# Altium footprint library 智能锁实践教学平台.PcbLib: 58 footprints (part 4 of 4)
Each footprint in its own frame and in the unit in brackets; x right, y up, seen from the top. Pads: shape width x height; smd on the part's side, far side on the other; paste and mask are expansions set on the pad; w line width, h text height; cw(c..) or ccw(c..) is an arc to the next point about the centre after c.
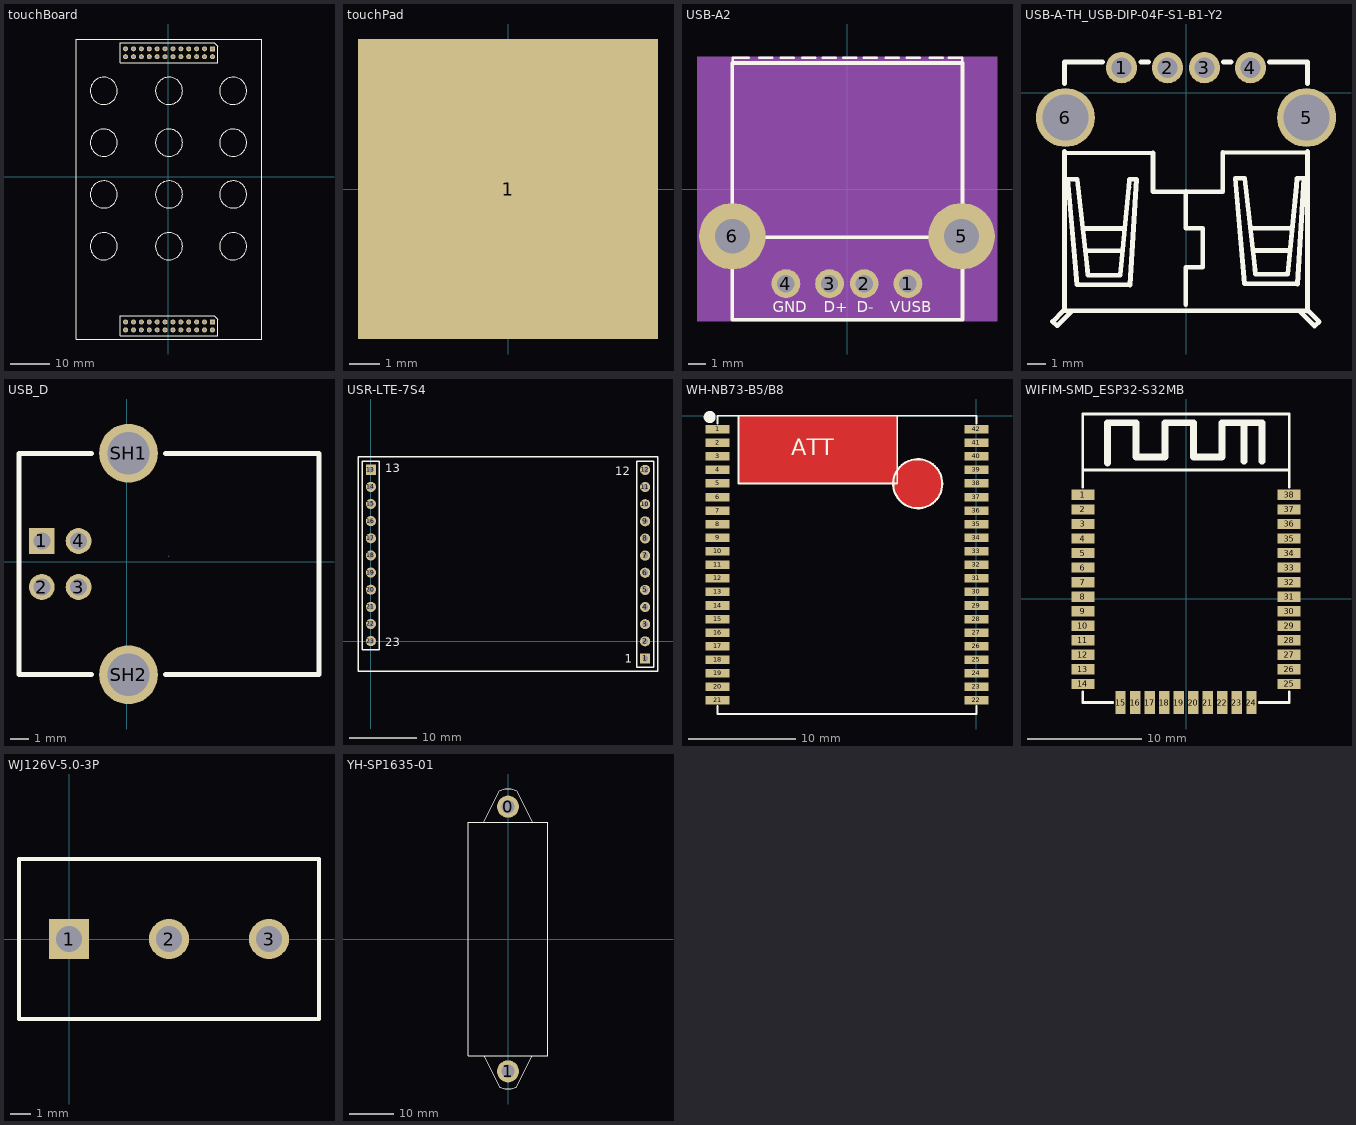
[diagram p3: the footprints below, top view; thin cyan lines are the x and y axes]

## touchBoard [mm]
pads (48):
  rect 1.27x1.27 / inner round 1.524 / far side rect 1.27x1.27 hole 0.7: 1(11.132,-36.846) 25(11.132,32.369)
  round 1.27 / inner round 1.524 / far side round 1.27 hole 0.7: 2(11.132,-38.846) 3(9.132,-36.846) 4(9.132,-38.846) 5(7.132,-36.846) 6(7.132,-38.846) 7(5.132,-36.846) 8(5.132,-38.846) 9(3.132,-36.846) 10(3.132,-38.846) 11(1.132,-36.846) 12(1.132,-38.846) 13(-0.868,-36.846) 14(-0.868,-38.846) 15(-2.868,-36.846) 16(-2.868,-38.846) 17(-4.868,-36.846) 18(-4.868,-38.846) 19(-6.868,-36.846) 20(-6.868,-38.846) 21(-8.868,-36.846) 22(-8.868,-38.846) 23(-10.868,-36.846) 24(-10.868,-38.846) 26(11.132,30.369) 27(9.132,32.369) 28(9.132,30.369) 29(7.132,32.369) 30(7.132,30.369) 31(5.132,32.369) 32(5.132,30.369) 33(3.132,32.369) 34(3.132,30.369) 35(1.132,32.369) 36(1.132,30.369) 37(-0.868,32.369) 38(-0.868,30.369) 39(-2.868,32.369) 40(-2.868,30.369) 41(-4.868,32.369) 42(-4.868,30.369) 43(-6.868,32.369) 44(-6.868,30.369) 45(-8.868,32.369) 46(-8.868,30.369) 47(-10.868,32.369) 48(-10.868,30.369)
Top Overlay:
  circle w0.254: c16.388,-17.653 r3.431
  circle w0.254: c0.132,-17.653 r3.431
  circle w0.254: c-16.378,-17.653 r3.431
  circle w0.254: c0.132,-4.53 r3.431
  circle w0.254: c-16.378,-4.53 r3.431
  circle w0.254: c-16.378,8.594 r3.431
  circle w0.254: c0.132,8.594 r3.431
  circle w0.254: c16.388,-4.53 r3.431
  circle w0.254: c16.388,8.594 r3.431
  circle w0.254: c16.388,21.717 r3.431
  circle w0.254: c0.132,21.717 r3.431
  circle w0.254: c-16.378,21.717 r3.431
  lines w0.203: -23.368,-41.148 23.632,-41.148 23.632,34.852 -23.368,34.852 -23.368,-41.148 ; -12.229,-40.386 12.432,-40.386 12.432,-36.176 11.562,-35.306 -12.229,-35.306 -12.229,-40.386 ; -12.229,28.829 12.432,28.829 12.432,33.039 11.562,33.909 -12.229,33.909 -12.229,28.829
Mechanical 8:
  text "3" at 8.878,-36.846 h0.64
  text "15" at -3.376,-36.846 h0.64
  text "14" at -1.376,-38.846 h0.64
  text "4" at 8.878,-38.846 h0.64
  text "13" at -1.376,-36.846 h0.64
  text "17" at -5.376,-36.846 h0.64
  text "18" at -5.376,-38.846 h0.64
  text "19" at -7.376,-36.846 h0.64
  text "20" at -7.376,-38.846 h0.64
  text "16" at -3.376,-38.846 h0.64
  text "8" at 4.878,-38.846 h0.64
  text "10" at 2.624,-38.846 h0.64
  text "7" at 4.878,-36.846 h0.64
  text "9" at 2.878,-36.846 h0.64
  text "12" at 0.624,-38.846 h0.64
  text "11" at 0.624,-36.846 h0.64
  text "6" at 6.878,-38.846 h0.64
  text "5" at 6.878,-36.846 h0.64
  text "1" at 10.878,-36.846 h0.64
  text "2" at 10.878,-38.846 h0.64
  text "3" at 8.878,32.369 h0.64
  text "15" at -3.376,32.369 h0.64
  text "14" at -1.376,30.369 h0.64
  text "4" at 8.878,30.369 h0.64
  text "13" at -1.376,32.369 h0.64
  text "17" at -5.376,32.369 h0.64
  text "18" at -5.376,30.369 h0.64
  text "19" at -7.376,32.369 h0.64
  text "20" at -7.376,30.369 h0.64
  text "16" at -3.376,30.369 h0.64
  text "8" at 4.878,30.369 h0.64
  text "10" at 2.624,30.369 h0.64
  text "7" at 4.878,32.369 h0.64
  text "9" at 2.878,32.369 h0.64
  text "12" at 0.624,30.369 h0.64
  text "11" at 0.624,32.369 h0.64
  text "6" at 6.878,30.369 h0.64
  text "5" at 6.878,32.369 h0.64
  text "1" at 10.878,32.369 h0.64
  text "2" at 10.878,30.369 h0.64

## touchPad [mm]
pads (1):
  rect 10x10 smd: 1(0,0)

## USB-A2 [mil] "USB-A2"
pads (6):
  round 65 / inner round 60 / far side round 65 hole 39.37: 1(137.6,-213.75) 2(39,-213.75) 3(-39.5,-213.75) 4(-138,-213.75)
  round 150 / inner round 60 / far side round 150 hole 78.74: 5(259,-106.75) 6(-259,-106.75)
Top Overlay:
  lines w6: -258.4,284.25 -258.4,296.25 -222.4,296.25 ; -198.4,296.25 -169.4,296.25 ; -149.4,296.25 -120.4,296.25 ; -101.4,296.25 -72.4,296.25 ; -54.4,296.25 -25.4,296.25 ; -8.4,296.25 20.6,296.25 ; 37.6,296.25 66.6,296.25 ; 87.6,296.25 116.6,296.25 ; 135.6,296.25 164.6,296.25 ; 187.6,296.25 216.6,296.25 ; 230.6,296.25 260.6,296.25 260.6,284.25
  lines w8: -259,-106.75 -259,-295.25 261,-295.25 261,284.75 -259,284.75 -259,-107.15 -257.4,-108.75 257.6,-108.75
  text "GND" at -167.4,-278.75 h25
  text "D+" at -52.4,-278.75 h25
  text "D-" at 22.6,-278.75 h25
  text "VUSB" at 97.6,-278.75 h25
Mechanical 8:
  text "6" at -259,-96.75 h25
  text "4" at -138,-203.75 h25
  text "5" at 259,-96.75 h25
  text "1" at 137.6,-203.75 h25
  text "3" at -39.5,-203.75 h25
  text "2" at 39,-203.75 h25
Mechanical 10:
  region: -339,-299.25 339,-299.25 339,299.25 -339,299.25

## USB-A-TH_USB-DIP-04F-S1-B1-Y2 [mm]
pads (6):
  round 1.7 hole 1.1: 1(-3.5,1.355) 2(-1,1.355) 3(1,1.355) 4(3.5,1.355)
  round 3.2 hole 2.5: 5(6.55,-1.355) 6(-6.55,-1.355)
Top Overlay:
  lines w0.254: -6.6,-3.292 -1.79,-3.266 -1.79,-5.388 1.99,-5.388 1.99,-3.245 6.59,-3.261 ; -6.6,-3.185 -6.6,-11.861 ; -6.6,0.475 -6.6,1.659 -4.537,1.659 ; -6.177,-11.861 -6.986,-12.67 -7.01,-12.67 -7.24,-12.44 -7.25,-12.44 -6.671,-11.861 -6.6,-11.861 ; -5.609,-7.385 -3.349,-7.385 ; -5.469,-8.595 -3.439,-8.595 ; -2.463,1.659 -2.037,1.659 ; -0.01,-11.525 -0.01,-9.495 0.91,-9.495 0.91,-7.375 -0.01,-7.375 -0.01,-5.355 ; 2.037,1.659 2.463,1.659 ; 3.49,-7.366 5.75,-7.366 ; 3.63,-8.576 5.66,-8.576 ; 4.537,1.659 6.6,1.659 6.6,0.475 ; 6.17,-11.87 6.979,-12.679 7.003,-12.679 7.233,-12.449 7.243,-12.449 6.664,-11.87 6.593,-11.87 ; 6.6,-3.185 6.6,-11.861 -6.6,-11.861 ; -6.42,-4.706 -5.911,-4.709 -5.401,-9.25 -5.325,-9.928 -3.576,-9.917 -3.102,-5.139 -3.072,-4.709 -2.691,-4.709 -3.041,-10.452 -5.925,-10.441 -6.42,-4.706 ; 2.682,-4.652 3.19,-4.656 3.701,-9.196 3.776,-9.874 5.526,-9.864 6,-5.085 6.03,-4.655 6.41,-4.655 6.06,-10.398 3.177,-10.387 2.682,-4.652

## USB_D [mm]
pads (6):
  rect 1.4x1.4 hole 0.92: 1(-4.602,1.123)
  round 1.4 hole 0.92: 2(-4.602,-1.377) 3(-2.602,-1.377) 4(-2.602,1.123)
  round 3.2 hole 2.3: SH1(0.108,5.893) SH2(0.108,-6.147)
Top Overlay:
  lines w0.254: -5.842,-6.128 -1.892,-6.128 ; -5.842,-6.128 -5.842,5.874 ; -5.842,5.873 -1.892,5.873 ; 2.108,-6.127 10.458,-6.127 10.458,5.874 ; 2.108,5.873 10.458,5.873
Mechanical 15:
  lines w0.003: 2.283,0.27 2.333,0.321

## USR-LTE-7S4 [mm]
pads (23):
  rect 1.5x1.5 hole 0.85: 1(40.64,-2.565) 13(0,25.4)
  round 1.5 hole 0.85: 2(40.64,-0.025) 3(40.64,2.515) 4(40.64,5.055) 5(40.64,7.595) 6(40.64,10.135) 7(40.64,12.675) 8(40.64,15.215) 9(40.64,17.755) 10(40.64,20.295) 11(40.64,22.835) 12(40.64,25.375) 14(0,22.86) 15(0,20.32) 16(0,17.78) 17(0,15.24) 18(0,12.7) 19(0,10.16) 20(0,7.62) 21(0,5.08) 22(0,2.54) 23(0,0)
Top Overlay:
  lines w0.2: -1.27,-1.27 1.27,-1.27 1.27,26.67 -1.27,26.67 -1.27,24.765 -1.27,-1.27 ; 39.37,-3.835 39.37,26.645 41.91,26.645 41.91,-1.93 41.91,-3.835 39.37,-3.835
  lines w0.203: -1.905,-4.445 -1.905,27.305 42.545,27.305 42.545,-4.445 -1.905,-4.445
  text "1" at 37.592,-3.2 h1.27
  text "12" at 36.195,24.613 h1.27
  text "13" at 2.16,24.994 h1.27
  text "23" at 2.159,-0.787 h1.27

## WH-NB73-B5/B8 [mm]
pads (42):
  rect 2.25x0.8 smd: 1(-24.25,-1.27) 2(-24.25,-2.54) 3(-24.25,-3.81) 4(-24.25,-5.08) 5(-24.25,-6.35) 6(-24.25,-7.62) 7(-24.25,-8.89) 8(-24.25,-10.16) 9(-24.25,-11.43) 10(-24.25,-12.7) 11(-24.25,-13.97) 12(-24.25,-15.24) 13(-24.25,-16.51) 14(-24.25,-17.78) 15(-24.25,-19.05) 16(-24.25,-20.32) 17(-24.25,-21.59) 18(-24.25,-22.86) 19(-24.25,-24.13) 20(-24.25,-25.4) 21(-24.25,-26.67) 22(0,-26.67) 23(0,-25.4) 24(0,-24.13) 25(0,-22.86) 26(0,-21.59) 27(0,-20.32) 28(0,-19.05) 29(0,-17.78) 30(0,-16.51) 31(0,-15.24) 32(0,-13.97) 33(0,-12.7) 34(0,-11.43) 35(0,-10.16) 36(0,-8.89) 37(0,-7.62) 38(0,-6.35) 39(0,-5.08) 40(0,-3.81) 41(0,-2.54) 42(0,-1.27)
Top Layer:
  pour cut-out: -22.285,-6.35 -22.285,0 -7.426,0 -7.426,-6.35
  pour cut-out: -3.189,-6.375 -3.233,-5.923 -3.365,-5.489 -3.579,-5.088 -3.867,-4.737 -4.218,-4.449 -4.619,-4.235 -5.053,-4.103 -5.505,-4.059 -5.505,-4.07 -5.55,-4.059 -5.99,-4.102 -6.414,-4.231 -6.804,-4.439 -7.146,-4.72 -7.427,-5.062 -7.635,-5.452 -7.764,-5.876 -7.807,-6.316 -7.796,-6.316 -7.807,-6.37 -7.762,-6.825 -7.63,-7.262 -7.414,-7.665 -7.124,-8.018 -6.771,-8.308 -6.368,-8.524 -5.931,-8.656 -5.476,-8.701 -5.476,-8.69 -5.46,-8.701 -5.017,-8.657 -4.591,-8.528 -4.198,-8.318 -3.854,-8.036 -3.572,-7.692 -3.362,-7.299 -3.233,-6.873 -3.189,-6.43 -3.2,-6.43
Top Overlay:
  circle w0.559: c-24.987,-0.127 r0.284
  circle w0.2: c-5.5,-6.375 r2.3
  lines w0.152: -24.25,-27.178 -24.25,-27.94 0,-27.94 0,-27.178 ; -24.25,-0.762 -24.25,0 0,0 0,-0.762 ; -22.285,-2.54 -22.285,-6.35 -10.412,-6.35 -7.426,-6.35 -7.426,-5.08 -7.426,0 ; -22.285,-2.508 -22.285,0
  text "ATT" at -17.332,-3.683 h1.52

## WIFIM-SMD_ESP32-S32MB [mm]
pads (38):
  rect 2x0.9 smd: 1(-9,9.068) 2(-9,7.798) 3(-9,6.528) 4(-9,5.258) 5(-9,3.988) 6(-9,2.718) 7(-9,1.448) 8(-9,0.178) 9(-9,-1.092) 10(-9,-2.362) 11(-9,-3.632) 12(-9,-4.902) 13(-9,-6.172) 14(-9,-7.442) 25(9,-7.442) 26(9,-6.172) 27(9,-4.902) 28(9,-3.632) 29(9,-2.362) 30(9,-1.092) 31(9,0.178) 32(9,1.448) 33(9,2.718) 34(9,3.988) 35(9,5.258) 36(9,6.528) 37(9,7.798) 38(9,9.068)
  rect 0.9x2 smd: 15(-5.715,-9.068) 16(-4.445,-9.068) 17(-3.175,-9.068) 18(-1.905,-9.068) 19(-0.635,-9.068) 20(0.635,-9.068) 21(1.905,-9.068) 22(3.175,-9.068) 23(4.445,-9.068) 24(5.715,-9.068)
Top Overlay:
  lines w0.254: -9.017,-8.123 -9.017,-9.068 -6.396,-9.068 ; -9.017,9.749 -9.017,16.132 9.017,16.132 9.017,9.749 ; -9.017,11.232 9.017,11.232 ; 6.396,-9.068 9.017,-9.068 9.017,-8.123
  lines w0.6: -6.85,11.868 -6.85,15.368 -4.35,15.368 ; -4.351,15.367 -4.351,12.367 -1.849,12.367 -1.849,15.367 0.65,15.367 0.65,12.367 3.149,12.367 3.149,15.367 6.65,15.367 6.65,12 ; 5.08,12 5.08,15.367

## WJ126V-5.0-3P [mm]
height 12
pads (3):
  rect 2x2 hole 1.3: 1(0,0)
  round 2 hole 1.3: 2(5,0) 3(10,0)
Top Overlay:
  lines w0.203: -2.5,-4 -2.5,4 12.5,4 12.5,-4 -2.5,-4

## YH-SP1635-01 [mm]
pads (2):
  round 5 hole 3: 0(0,30) 1(0,-30)
Top Overlay:
  lines w0.254: -5.5,-26.5 -2,-33.464 ccw(c0,-30) 2,-33.464 5.5,-26.5 ; -5.5,26.5 -2,33.464 cw(c0,30) 2,33.464 5.5,26.5 ; -9,-26.5 -9,26.5 9,26.5 9,-26.5 -9,-26.5